# Altium integrated library Lib_MS_V4.0.IntLib: 296 symbols (part 1 of 2) (continued)
## IC_ATMEGA328P-AU (continued)
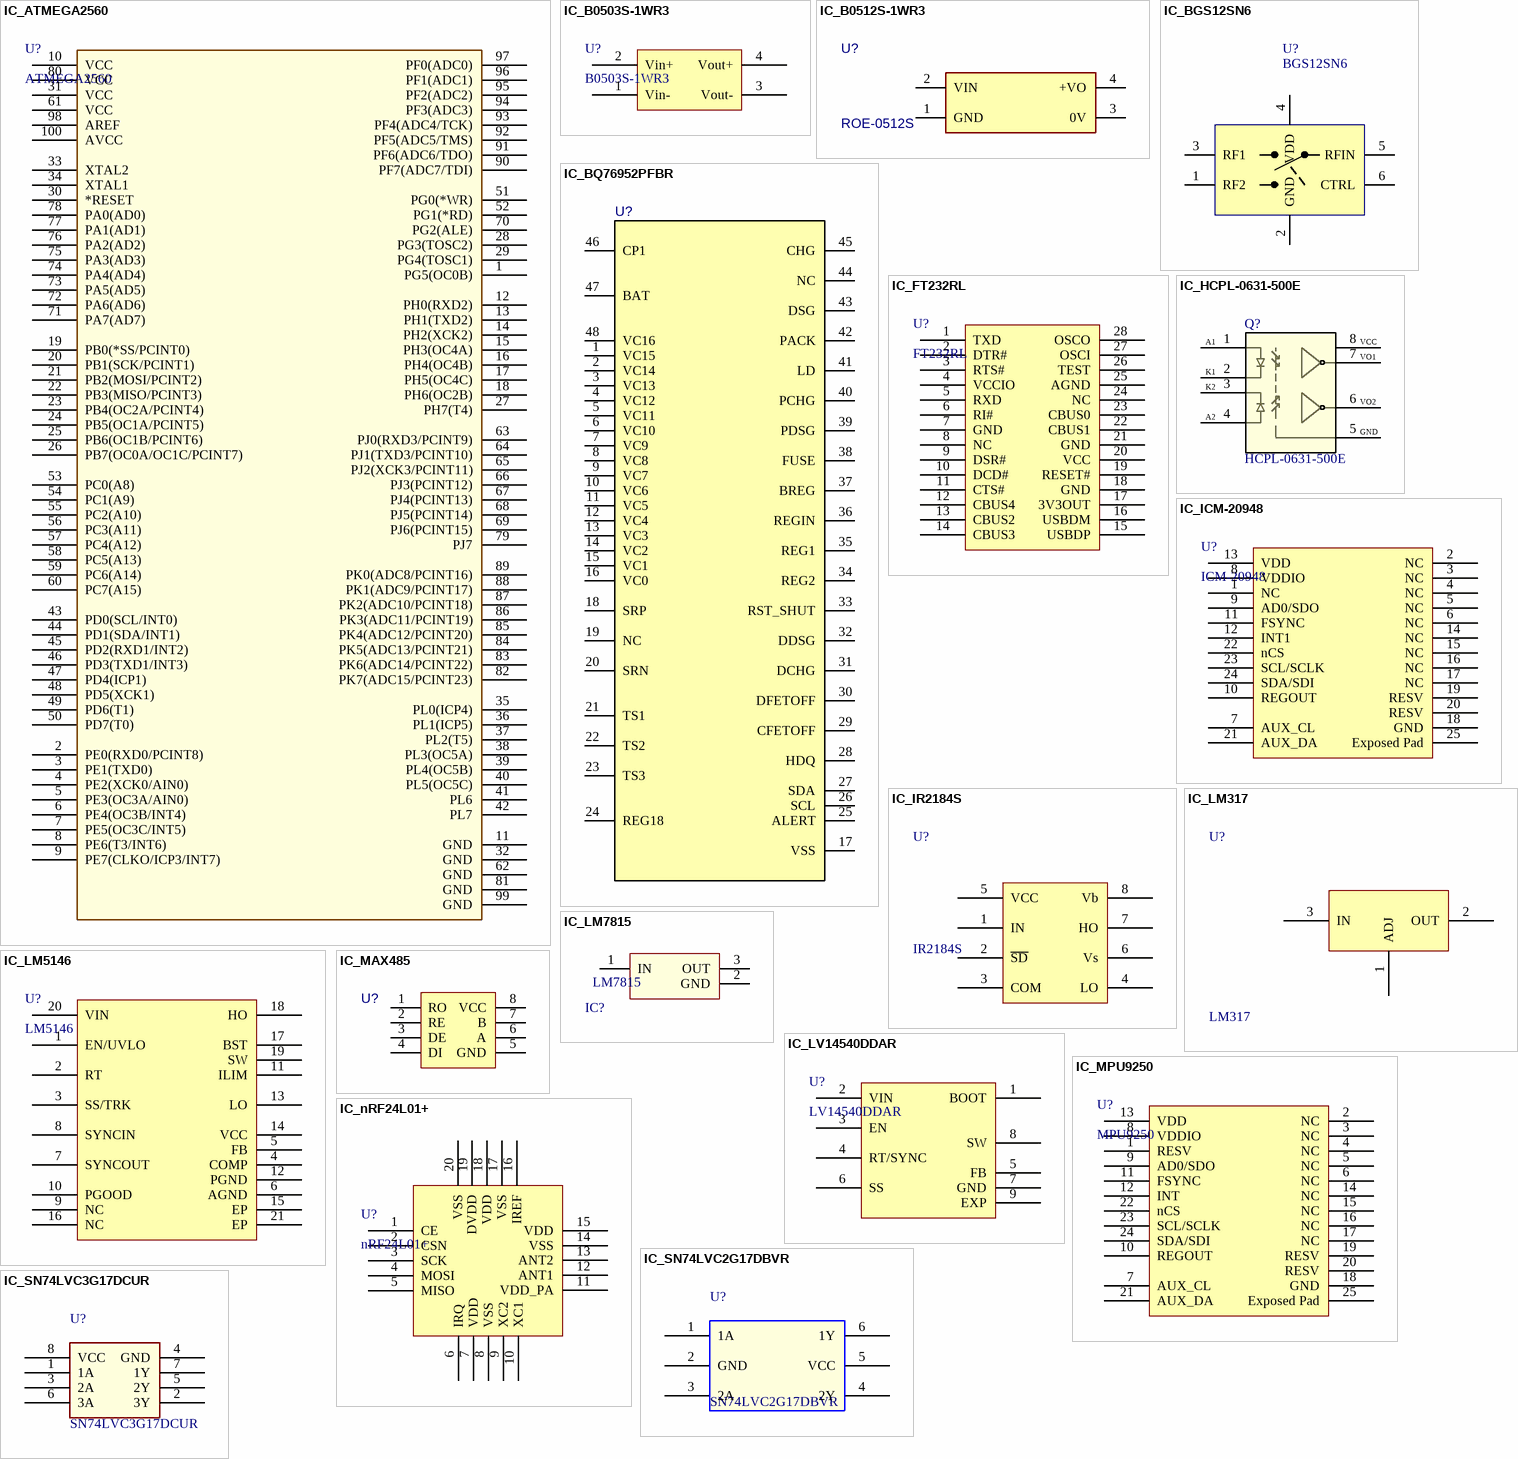
[diagram p3: symbols IC_ATMEGA2560 to IC_SN74LVC3G17DCUR]

## IC_ATMEGA2560
designator U?, comment ATMEGA2560
AVR AVR® ATmega Microcontroller IC 8-Bit 16MHz 256KB (128K x 16) FLASH 100-TQFP (14x14); Sort: MCU; ComponentLink1Description: New link; ComponentLink1URL: https://banlinhkien.com/atmega256016au-tqfp100-p6649411.html; Package: 100-TQFP
footprint IC_ATMEGA2560AU
pins: 1 PG5(OC0B), 2 PE0(RXD0/PCINT8), 3 PE1(TXD0), 4 PE2(XCK0/AIN0), 5 PE3(OC3A/AIN0), 6 PE4(OC3B/INT4), 7 PE5(OC3C/INT5), 8 PE6(T3/INT6), 9 PE7(CLKO/ICP3/INT7), 10 VCC, 11 GND, 12 PH0(RXD2), 13 PH1(TXD2), 14 PH2(XCK2), 15 PH3(OC4A), 16 PH4(OC4B), 17 PH5(OC4C), 18 PH6(OC2B), 19 PB0(*SS/PCINT0), 20 PB1(SCK/PCINT1), 21 PB2(MOSI/PCINT2), 22 PB3(MISO/PCINT3), 23 PB4(OC2A/PCINT4), 24 PB5(OC1A/PCINT5), 25 PB6(OC1B/PCINT6), 26 PB7(OC0A/OC1C/PCINT7), 27 PH7(T4), 28 PG3(TOSC2), 29 PG4(TOSC1), 30 *RESET, 31 VCC, 32 GND, 33 XTAL2, 34 XTAL1, 35 PL0(ICP4), 36 PL1(ICP5), 37 PL2(T5), 38 PL3(OC5A), 39 PL4(OC5B), 40 PL5(OC5C), 41 PL6, 42 PL7, 43 PD0(SCL/INT0), 44 PD1(SDA/INT1), 45 PD2(RXD1/INT2), 46 PD3(TXD1/INT3), 47 PD4(ICP1), 48 PD5(XCK1), 49 PD6(T1), 50 PD7(T0), 51 PG0(*WR), 52 PG1(*RD), 53 PC0(A8), 54 PC1(A9), 55 PC2(A10), 56 PC3(A11), 57 PC4(A12), 58 PC5(A13), 59 PC6(A14), 60 PC7(A15), 61 VCC, 62 GND, 63 PJ0(RXD3/PCINT9), 64 PJ1(TXD3/PCINT10), 65 PJ2(XCK3/PCINT11), 66 PJ3(PCINT12), 67 PJ4(PCINT13), 68 PJ5(PCINT14), 69 PJ6(PCINT15), 70 PG2(ALE), 71 PA7(AD7), 72 PA6(AD6), 73 PA5(AD5), 74 PA4(AD4), 75 PA3(AD3), 76 PA2(AD2), 77 PA1(AD1), 78 PA0(AD0), 79 PJ7, 80 VCC, 81 GND, 82 PK7(ADC15/PCINT23), 83 PK6(ADC14/PCINT22), 84 PK5(ADC13/PCINT21), 85 PK4(ADC12/PCINT20), 86 PK3(ADC11/PCINT19), 87 PK2(ADC10/PCINT18), 88 PK1(ADC9/PCINT17), 89 PK0(ADC8/PCINT16), 90 PF7(ADC7/TDI), 91 PF6(ADC6/TDO), 92 PF5(ADC5/TMS), 93 PF4(ADC4/TCK), 94 PF3(ADC3), 95 PF2(ADC2), 96 PF1(ADC1), 97 PF0(ADC0), 98 AREF, 99 GND, 100 AVCC

## IC_B0503S-1WR3
designator U?, comment B0503S-1WR3
Isolated Module DC DC Converter 1 Output 3.3V 303mA 4.5V - 5.5V Input; Sort: Module Isolated DC-DC; ComponentLink1Description: HS; ComponentLink1URL: https://hshop.vn/nguon-cach-ly-dc-dc-isolated-power-module-hi-link-hlk-b0503s-1wr3-5vdc-to-3-3vdc-1w; ComponentLink2Description: DIGIKEY; ComponentLink2URL: https://www.digikey.bg/en/products/detail/mornsun-america-llc/B0503S-1WR3/13168314?s=N4IgTCBcDaIEIAYCsCDMBlAtARgOoCVUQBdAXyA
footprint IC_B0503S-1WR3
pins: 1 Vin-, 2 Vin+, 3 Vout-, 4 Vout+

## IC_B0512S-1WR3
designator U?, comment ROE-0512S
Isolated Module DC DC Converter 1 Output 12V 84mA 4.5V - 5.5V Input; Power: 1W; Description SEL: DC DC CONVERTER 12V 1W; Part Number: ROE-0512S; Input: 4.5V-5.5V; Output: 12V; Current: 84mA; ComponentLink1Description: DIGIKEY; ComponentLink1URL: https://www.digikey.com/en/products/detail/recom-power/ROE-0512S/5684098
footprint IC_ROE-0512S
pins: 1 GND (power), 2 VIN, 3 0V, 4 +VO

## IC_BGS12SN6
designator U?, comment BGS12SN6
DC switch - Ultra-Low  SPDT analog switch; Manufacturer: INFINEON; Sort: RF Switch; Manufacturer_Part_Number: BGS12SN6; ComponentLink1Description: MOUSER; ComponentLink1URL: https://www.mouser.vn/ProductDetail/Infineon-Technologies/BGS12SN6E6327XTSA1?qs=3%2FhYFTG7CVeGtqdjCCQooA%3D%3D
footprint SON40P70X40-6N (SON, 6-Leads, Body 1.10x0.70mm, Pitch 0.40mm)
pins: 1 RF2, 2 GND, 3 RF1, 4 VDD, 5 RFIN, 6 CTRL

## IC_BQ76952PFBR
designator U?, comment BQ76952PFBR  (value not drawn)
IC BAT LIFEPO4/LI-ION 3-16C TQFP; Manufacturer: Texas Instruments; Point: 48; Part Number: BQ76952PFBR; Description SEL: IC BAT LIFEPO4/LI-ION 3-16C TQFP; ComponentLink1Description: DIGIKEY; ComponentLink1URL: https://www.digikey.com/en/products/detail/texas-instruments/BQ76952PFBR/13427864
footprint IC_BQ76952PFBR
pins: 1 VC15, 2 VC14, 3 VC13, 4 VC12, 5 VC11, 6 VC10, 7 VC9, 8 VC8, 9 VC7, 10 VC6, 11 VC5, 12 VC4, 13 VC3, 14 VC2, 15 VC1, 16 VC0, 17 VSS, 18 SRP, 19 NC, 20 SRN, 21 TS1, 22 TS2, 23 TS3, 24 REG18, 25 ALERT, 26 SCL, 27 SDA, 28 HDQ, 29 CFETOFF, 30 DFETOFF, 31 DCHG, 32 DDSG, 33 RST_SHUT, 34 REG2, 35 REG1, 36 REGIN, 37 BREG, 38 FUSE, 39 PDSG, 40 PCHG, 41 LD, 42 PACK, 43 DSG, 44 NC, 45 CHG, 46 CP1, 47 BAT, 48 VC16

## IC_FT232RL
designator U?, comment FT232RL
USB FULL SPEED TO SERIAL UART IC; Sort: USB FS SERIAL UART; ComponentLink1Description: LKCG; ComponentLink1URL: https://lkcg.vn/linh-kien-ic-ft232rl-chan-dan-ssop28; ComponentLink2Description: DIGIKEY; ComponentLink2URL: https://www.digikey.bg/en/products/detail/ftdi-future-technology-devices-international-ltd/FT232RNL-REEL/16836345
footprint IC_FT232RL
pins: 1 TXD, 2 DTR#, 3 RTS#, 4 VCCIO, 5 RXD, 6 RI#, 7 GND, 8 NC, 9 DSR#, 10 DCD#, 11 CTS#, 12 CBUS4, 13 CBUS2, 14 CBUS3, 15 USBDP, 16 USBDM, 17 3V3OUT, 18 GND, 19 RESET#, 20 VCC, 21 GND, 22 CBUS1, 23 CBUS0, 24 NC, 25 AGND, 26 TEST, 27 OSCI, 28 OSCO

## IC_HCPL-0631-500E
designator Q?, comment HCPL-0631-500E
OPTOISO 3.75KV 2CH OPEN COLL 8SO; Mfr_Name: Broadcom; Type: Optoisolators; ComponentLink1Description: LKD; ComponentLink1URL: https://banlinhkiendientu.vn/hcpl-0631/; ComponentLink2Description: DIGIKEY; ComponentLink2URL: https://www.digikey.com/en/products/detail/broadcom-limited/HCPL-0631-500E/768373; MSL: 1; Temperature: -40°C ~ 85°C
footprint IC_HCPL-0631-500E
pins: 1, 2, 3, 4, 5 GND, 6, 7, 8
text: A1; VCC; VO1; K1; K2; VO2; A2

## IC_ICM-20948
designator U?, comment ICM-20948
Accelerometer, Gyroscope, Magnetometer, 9 Axis Sensor I2C, SPI Output; Sort: IMU; ComponentLink1Description: DIGIKEY; ComponentLink1URL: https://www.digikey.com/en/products/detail/tdk-invensense/ICM-20948/6623535; Package: 24-QFN
footprint IC_MPU9250
pins: 1 NC, 2 NC, 3 NC, 4 NC, 5 NC, 6 NC, 7 AUX_CL, 8 VDDIO, 9 AD0/SDO, 10 REGOUT, 11 FSYNC, 12 INT1, 13 VDD, 14 NC, 15 NC, 16 NC, 17 NC, 18 GND, 19 RESV, 20 RESV, 21 AUX_DA, 22 nCS, 23 SCL/SCLK, 24 SDA/SDI, 25 Exposed Pad

## IC_IR2184S
designator U?, comment IR2184S
Half-Bridge Driver; Manufacture: Infineon Technologies; Mouting Type: SMD; ComponentLink1Description: BLK; ComponentLink1URL: https://banlinhkien.com/ir2184s-sop8-600v-halfbridge-driver-1.4a1.8a-p6653151.html; ComponentLink2Description: Mouser; ComponentLink2URL: https://www.mouser.vn/ProductDetail/Infineon-Technologies/IR2184STRPBF?qs=ellYJlE8XiF5tKx1UCxEUw%3D%3D; Sort: Half-Bridge; Manufacture Part Number: IR2184S; MSL: 1; Temperature: -40°C ~ 150°C
footprint IC_IR2184S
pins: 1 IN, 2 ~{SD}, 3 COM, 4 LO, 5 VCC, 6 Vs, 7 HO, 8 Vb

## IC_LM317
designator U?, comment LM317
Linear Voltage Regulator IC Positive Adjustable 1 Output 1.5A TO-220; Manufacturer: Lumimax Optoelectronic Technology; Vin: 4.2V - 40V; Vout: 1.2V - 37V; Part Number: LM317; Current: 1.5A; Package: TO-220; ComponentLink1Description: BLK; ComponentLink1URL: https://banlinhkien.com/lm317t-to220-reg-ldo-adj-1.5a-p6651263.html; ComponentLink2Description: DIGIKEY; ComponentLink2URL: https://www.digikey.bg/en/products/detail/lumimax-optoelectronic-technology/LM317/24373406
footprint IC_LM7815
pins: 1 ADJ, 2 OUT, 3 IN

## IC_LM5146
designator U?, comment LM5146
Buck Regulator Positive Output Step-Down DC-DC Controller IC 20-VQFN (3.5x4.5); Manufacturer: Texas Instruments; Part Number: LM5146RGYR; Sort: IC REG BUCK; MSL: 2; ComponentLink1Description: DIGIKEY; ComponentLink1URL: https://www.digikey.bg/en/products/detail/texas-instruments/LM5146RGYR/14544372
footprint IC_LM5146
pins: 1 EN/UVLO, 2 RT, 3 SS/TRK, 4 COMP, 5 FB, 6 AGND, 7 SYNCOUT, 8 SYNCIN, 9 NC, 10 PGOOD, 11 ILIM, 12 PGND, 13 LO, 14 VCC, 15 EP, 16 NC, 17 BST, 18 HO, 19 SW, 20 VIN, 21 EP

## IC_LM7815
designator IC?, comment LM7815
Linear Voltage Regulator IC Positive Fixed 1 Output 1A TO-220-3; Manufacturer: Texas Instruments; Part Number: LM7815CT/NOPB; Vin: 35V; Vout: 15V; Current: 1A; Package: TO-220-3
footprint IC_LM7815
pins: 1 IN, 2 GND, 3 OUT

## IC_LV14540DDAR
designator U?, comment LV14540DDAR
Buck Switching Regulator IC Positive Adjustable 0.8V 1 Output 5A 8-PowerSOIC (0.154", 3.90mm Width); Sort: IC Reg Buck; ComponentLink1Description: Aliexpress; ComponentLink1URL: https://vi.aliexpress.com/item/1005008065358411.html?spm=a2g0o.productlist.main.1.7e89Dx16Dx16m5&algo_pvid=ad094eb1-607a-4bec-86f1-b8c480b560e9&algo_exp_id=ad094eb1-607a-4bec-86f1-b8c480b560e9-0&pdp_ext_f=%7B%22order%22%3A%22-1%22%2C%22eval%22%3A%221%22%7D&pdp_npi=4%40dis%21VND%2162327%2162327%21%21%2117.30%2117.30%21%402140f53817468421014663818eb33d%2112000043513459686%21sea%21VN%214100105060%21X&curPageLogUid=bj85XK5ikHDZ&utparam-url=scene%3Asearch%7Cquery_from%3A; ComponentLink2Description: MOUSER; ComponentLink2URL: https://www.mouser.vn/ProductDetail/Texas-Instruments/LV14540DDAR?qs=GBLSl2Akiru4zvJrnTzNww%3D%3D; Package: 8-PowerSOIC
footprint IC_LV14540DDAR_SOIC
pins: 1 BOOT, 2 VIN, 3 EN, 4 RT/SYNC, 5 FB, 6 SS, 7 GND, 8 SW, 9 EXP

## IC_MAX485
designator U?, comment MAX485  (value not drawn)
Part Number: MAX485ESA+T; Description SEL: IC TRANSCEIVER HALF 1/1 8SOIC; Sort: TRANSCEIVER; ComponentLink1Description: LKD; ComponentLink1URL: https://banlinhkiendientu.vn/max485-max485csa/; Package: 8-SOIC
footprint SOIC8_NOTHERMAL
pins: 1 RO, 2 RE, 3 DE, 4 DI, 5 GND, 6 A, 7 B, 8 VCC

## IC_MPU9250
designator U?, comment MPU9250
Accelerometer, Gyroscope, Magnetometer, 9 Axis Sensor I2C, SPI Output; Sort: IMU; ComponentLink1Description: CXT; ComponentLink1URL: https://linhkien.cxtvn.com/6790-mpu-9250-imu-accelgyromag-i2cspi-24qfn.html; Package: 24-QFN
footprint IC_MPU9250
pins: 1 RESV, 2 NC, 3 NC, 4 NC, 5 NC, 6 NC, 7 AUX_CL, 8 VDDIO, 9 AD0/SDO, 10 REGOUT, 11 FSYNC, 12 INT, 13 VDD, 14 NC, 15 NC, 16 NC, 17 NC, 18 GND, 19 RESV, 20 RESV, 21 AUX_DA, 22 nCS, 23 SCL/SCLK, 24 SDA/SDI, 25 Exposed Pad

## IC_nRF24L01+
designator U?, comment nRF24L01+
Single Chip 2.4GHz Transceiver; Sort: RF; Package: QFN20 4X4
footprint IC_ nRF24L01+
pins: 1 CE, 2 CSN, 3 SCK, 4 MOSI, 5 MISO, 6 IRQ, 7 VDD, 8 VSS, 9 XC2, 10 XC1, 11 VDD_PA, 12 ANT1, 13 ANT2, 14 VSS, 15 VDD, 16 IREF, 17 VSS, 18 VDD, 19 DVDD, 20 VSS

## IC_SN74LVC2G17DBVR
designator U?, comment SN74LVC2G17DBVR
IC BUF NON-INVERT 5.5V SC70-6; Mfr_Name: Texas Instruments; Mouting type: SMD; Sort: BUFF NON-INVERT; Manufacturer_Part_Number: SN74LVC2G17DBVR; MSL: 1; ComponentLink1Description: DIGIKEY; ComponentLink1URL: https://www.digikey.bg/en/products/detail/texas-instruments/SN74LVC2G17DBVR/479735; Package: SOT-23-6
footprint IC_SN74LVC2G17DBVR
pins: 1 1A, 2 GND, 3 2A, 4 2Y, 5 VCC, 6 1Y

## IC_SN74LVC3G17DCUR
designator U?, comment SN74LVC3G17DCUR
Buffer, Non-Inverting 3 Element 1 Bit per Element Push-Pull Output 8-VSSOP; Mfr_Name: Texas Instruments; Mouting type: SMD; Sort: BUFF NON-INVERT; Manufacturer_Part_Number: SN74LVC3G17DCUR; MSL: 1; ComponentLink1Description: CXT; ComponentLink1URL: https://linhkien.cxtvn.com/10332-sn74lvc3g17dcur-ic-buffer-non-invert-55v-8vssop.html; ComponentLink2Description: DIGIKEY; ComponentLink2URL: https://www.digikey.com/en/products/detail/texas-instruments/SN74LVC3G17DCUR/863652; Package: 8-VSSOP
footprint IC_SN74LVC3G17DCUR
pins: 1 1A, 2 3Y, 3 2A, 4 GND, 5 2Y, 6 3A, 7 1Y, 8 VCC

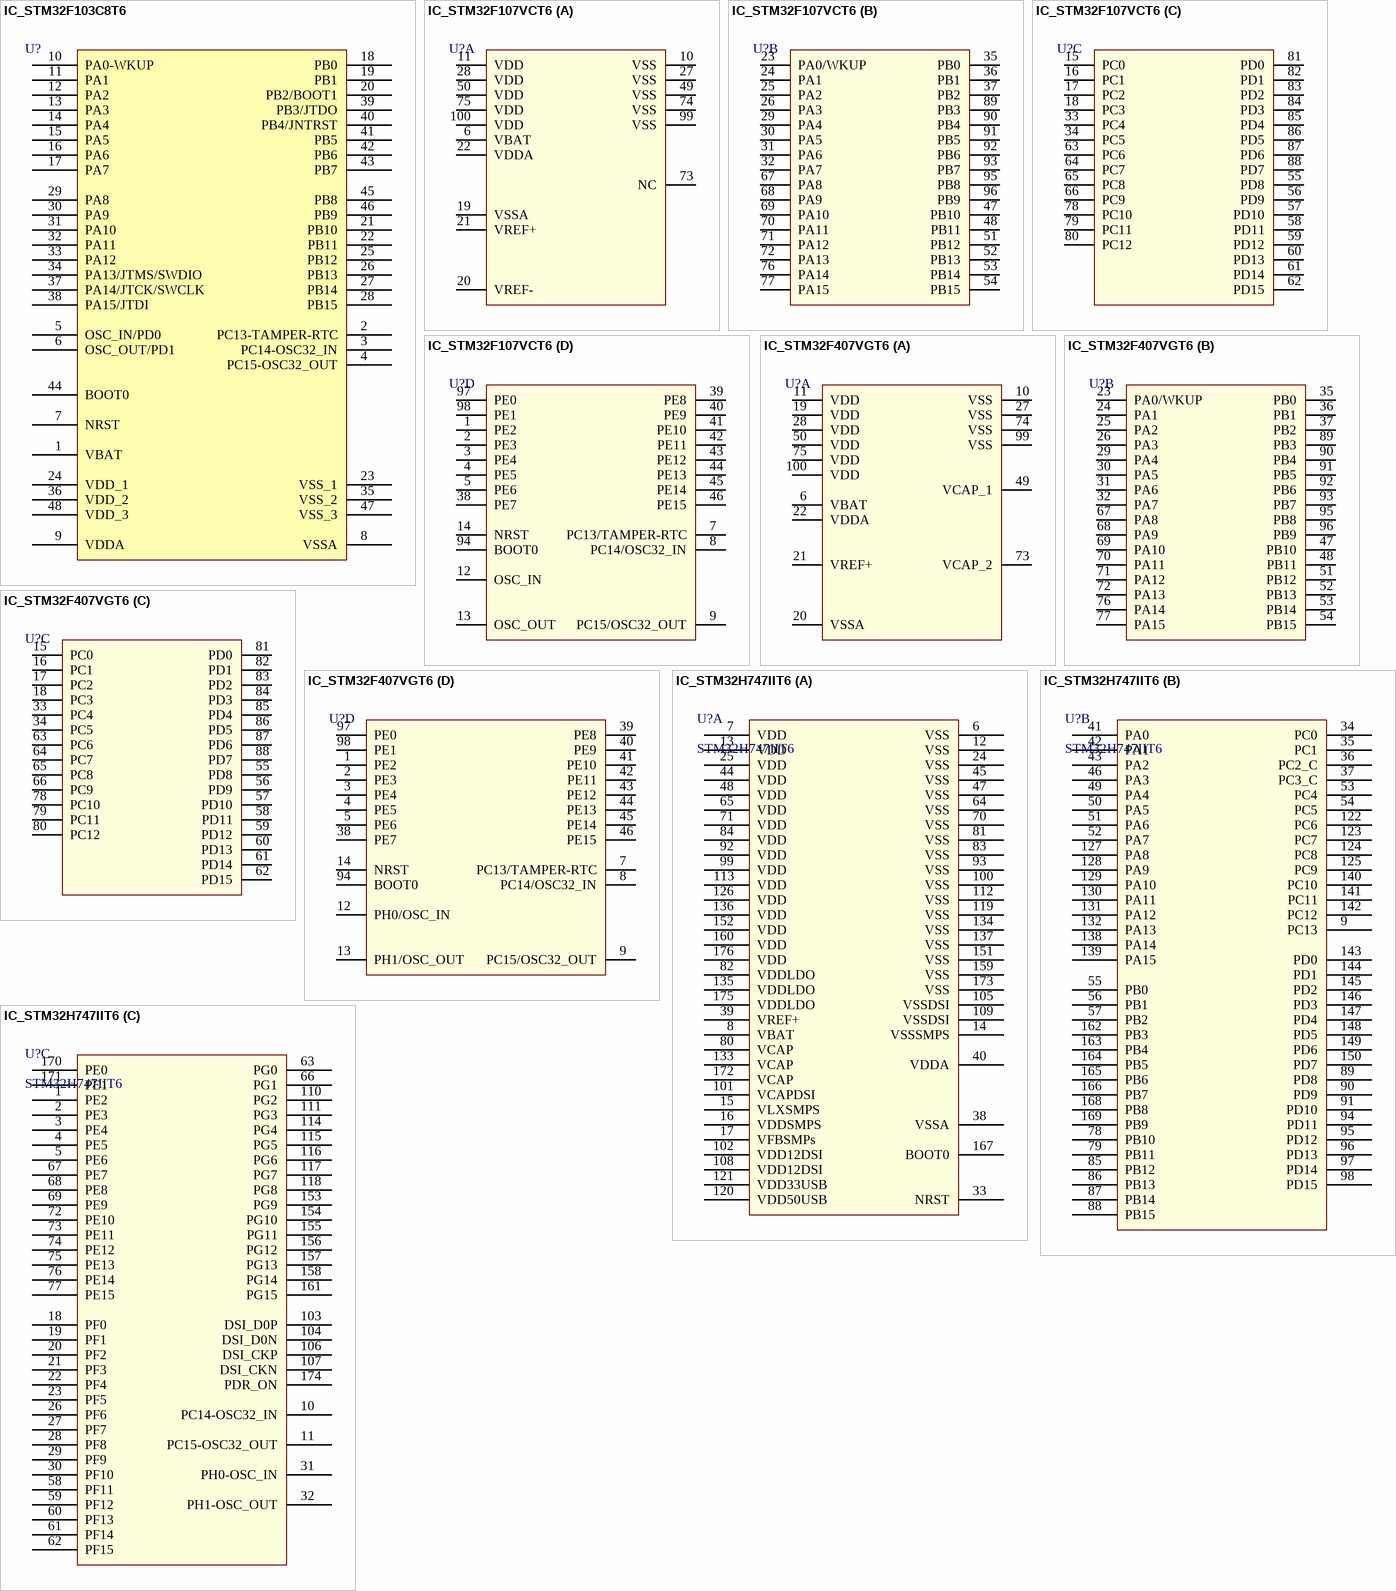
[diagram p4: symbols IC_STM32F103C8T6 to IC_STM32H747IIT6]

## IC_STM32F103C8T6
designator U?, comment STM32F103C8T6  (value not drawn)
STM32 ARM-based 32-bit MCU with 64 Kbytes Flash, 48-pin LQFP, Industrial Temperature; PackageReference: LQFP48; ComponentLink3Description: CXT; ComponentLink3URL: https://linhkien.cxtvn.com/1130-stm32f103c8t6-ic-mcu-32-bit-64kb-flash-48lqfp.html; Sort: MCU
footprint IC_STM32F103C8T6
pins: 1 VBAT, 2 PC13-TAMPER-RTC, 3 PC14-OSC32_IN, 4 PC15-OSC32_OUT, 5 OSC_IN/PD0, 6 OSC_OUT/PD1, 7 NRST, 8 VSSA, 9 VDDA, 10 PA0-WKUP, 11 PA1, 12 PA2, 13 PA3, 14 PA4, 15 PA5, 16 PA6, 17 PA7, 18 PB0, 19 PB1, 20 PB2/BOOT1, 21 PB10, 22 PB11, 23 VSS_1, 24 VDD_1, 25 PB12, 26 PB13, 27 PB14, 28 PB15, 29 PA8, 30 PA9, 31 PA10, 32 PA11, 33 PA12, 34 PA13/JTMS/SWDIO, 35 VSS_2, 36 VDD_2, 37 PA14/JTCK/SWCLK, 38 PA15/JTDI, 39 PB3/JTDO, 40 PB4/JNTRST, 41 PB5, 42 PB6, 43 PB7, 44 BOOT0, 45 PB8, 46 PB9, 47 VSS_3, 48 VDD_3

## IC_STM32F107VCT6
designator U?, comment STM32F107VCT6  (value not drawn)
Sort: MCU; ComponentLink1Description: CXT; ComponentLink1URL: https://linhkien.cxtvn.com/1565-stm32f107vct6-ic-mcu-32-bit-256kb-flash-lqfp100.html; ComponentLink2Description: MOUSER; ComponentLink2URL: https://www.mouser.vn/ProductDetail/STMicroelectronics/STM32F107VCT6?qs=1XJIe8X6XT1KmS9%252Be0Uqlg%3D%3D&srsltid=AfmBOook5THpVA88VouslcCXgHKMMoEBzzSPGBngcTiByRy0ecgl8l23; Package: 100LQFP
footprint IC_STM32F107VCT6
part A pins: 6 VBAT, 10 VSS, 11 VDD, 19 VSSA, 20 VREF-, 21 VREF+, 22 VDDA, 27 VSS, 28 VDD, 49 VSS, 50 VDD, 73 NC, 74 VSS, 75 VDD, 99 VSS, 100 VDD
part B pins: 23 PA0/WKUP, 24 PA1, 25 PA2, 26 PA3, 29 PA4, 30 PA5, 31 PA6, 32 PA7, 35 PB0, 36 PB1, 37 PB2, 47 PB10, 48 PB11, 51 PB12, 52 PB13, 53 PB14, 54 PB15, 67 PA8, 68 PA9, 69 PA10, 70 PA11, 71 PA12, 72 PA13, 76 PA14, 77 PA15, 89 PB3, 90 PB4, 91 PB5, 92 PB6, 93 PB7, 95 PB8, 96 PB9
part C pins: 15 PC0, 16 PC1, 17 PC2, 18 PC3, 33 PC4, 34 PC5, 55 PD8, 56 PD9, 57 PD10, 58 PD11, 59 PD12, 60 PD13, 61 PD14, 62 PD15, 63 PC6, 64 PC7, 65 PC8, 66 PC9, 78 PC10, 79 PC11, 80 PC12, 81 PD0, 82 PD1, 83 PD2, 84 PD3, 85 PD4, 86 PD5, 87 PD6, 88 PD7
part D pins: 1 PE2, 2 PE3, 3 PE4, 4 PE5, 5 PE6, 7 PC13/TAMPER-RTC, 8 PC14/OSC32_IN, 9 PC15/OSC32_OUT, 12 OSC_IN, 13 OSC_OUT, 14 NRST, 38 PE7, 39 PE8, 40 PE9, 41 PE10, 42 PE11, 43 PE12, 44 PE13, 45 PE14, 46 PE15, 94 BOOT0, 97 PE0, 98 PE1

## IC_STM32F407VGT6
designator U?, comment STM32F407VGT6  (value not drawn)
Sort: MCU; ComponentLink1Description: CXT; ComponentLink1URL: https://linhkien.cxtvn.com/1555-stm32f407vgt6ic-mcu-32bit-1mb-flash-100lqfp.html; Package: 100LQFP
footprint IC_STM32F107VCT6
part A pins: 6 VBAT, 10 VSS, 11 VDD, 19 VDD, 20 VSSA, 21 VREF+, 22 VDDA, 27 VSS, 28 VDD, 49 VCAP_1, 50 VDD, 73 VCAP_2, 74 VSS, 75 VDD, 99 VSS, 100 VDD
part B pins: 23 PA0/WKUP, 24 PA1, 25 PA2, 26 PA3, 29 PA4, 30 PA5, 31 PA6, 32 PA7, 35 PB0, 36 PB1, 37 PB2, 47 PB10, 48 PB11, 51 PB12, 52 PB13, 53 PB14, 54 PB15, 67 PA8, 68 PA9, 69 PA10, 70 PA11, 71 PA12, 72 PA13, 76 PA14, 77 PA15, 89 PB3, 90 PB4, 91 PB5, 92 PB6, 93 PB7, 95 PB8, 96 PB9
part C pins: 15 PC0, 16 PC1, 17 PC2, 18 PC3, 33 PC4, 34 PC5, 55 PD8, 56 PD9, 57 PD10, 58 PD11, 59 PD12, 60 PD13, 61 PD14, 62 PD15, 63 PC6, 64 PC7, 65 PC8, 66 PC9, 78 PC10, 79 PC11, 80 PC12, 81 PD0, 82 PD1, 83 PD2, 84 PD3, 85 PD4, 86 PD5, 87 PD6, 88 PD7
part D pins: 1 PE2, 2 PE3, 3 PE4, 4 PE5, 5 PE6, 7 PC13/TAMPER-RTC, 8 PC14/OSC32_IN, 9 PC15/OSC32_OUT, 12 PH0/OSC_IN, 13 PH1/OSC_OUT, 14 NRST, 38 PE7, 39 PE8, 40 PE9, 41 PE10, 42 PE11, 43 PE12, 44 PE13, 45 PE14, 46 PE15, 94 BOOT0, 97 PE0, 98 PE1

## IC_STM32H747IIT6
designator U?, comment STM32H747IIT6
IC MCU 32BIT 2MB FLASH 176LQFP; ComponentLink1Description: DIGIKEY; ComponentLink1URL: https://www.digikey.com/en/products/detail/stmicroelectronics/STM32H747IIT6/10326796?s=N4IgTCBcDaIMoBUCyBmMAJA7AFkwSTwQDYQBdAXyA; Package: 176-LQFP; Sort: MCU; Temperature: -40°C ~ 85°C; MSL: 3
footprint IC_STM32H747IIT6
part A pins: 6 VSS, 7 VDD, 8 VBAT, 12 VSS, 13 VDD, 14 VSSSMPS, 15 VLXSMPS, 16 VDDSMPS, 17 VFBSMPs, 24 VSS, 25 VDD, 33 NRST, 38 VSSA, 39 VREF+, 40 VDDA, 44 VDD, 45 VSS, 47 VSS, 48 VDD, 64 VSS, 65 VDD, 70 VSS, 71 VDD, 80 VCAP, 81 VSS, 82 VDDLDO, 83 VSS, 84 VDD, 92 VDD, 93 VSS, 99 VDD, 100 VSS, 101 VCAPDSI, 102 VDD12DSI, 105 VSSDSI, 108 VDD12DSI, 109 VSSDSI, 112 VSS, 113 VDD, 119 VSS, 120 VDD50USB, 121 VDD33USB, 126 VDD, 133 VCAP, 134 VSS, 135 VDDLDO, 136 VDD, 137 VSS, 151 VSS, 152 VDD, 159 VSS, 160 VDD, 167 BOOT0, 172 VCAP, 173 VSS, 175 VDDLDO, 176 VDD
part B pins: 9 PC13, 34 PC0, 35 PC1, 36 PC2_C, 37 PC3_C, 41 PA0, 42 PA1, 43 PA2, 46 PA3, 49 PA4, 50 PA5, 51 PA6, 52 PA7, 53 PC4, 54 PC5, 55 PB0, 56 PB1, 57 PB2, 78 PB10, 79 PB11, 85 PB12, 86 PB13, 87 PB14, 88 PB15, 89 PD8, 90 PD9, 91 PD10, 94 PD11, 95 PD12, 96 PD13, 97 PD14, 98 PD15, 122 PC6, 123 PC7, 124 PC8, 125 PC9, 127 PA8, 128 PA9, 129 PA10, 130 PA11, 131 PA12, 132 PA13, 138 PA14, 139 PA15, 140 PC10, 141 PC11, 142 PC12, 143 PD0, 144 PD1, 145 PD2, 146 PD3, 147 PD4, 148 PD5, 149 PD6, 150 PD7, 162 PB3, 163 PB4, 164 PB5, 165 PB6, 166 PB7, 168 PB8, 169 PB9
part C pins: 1 PE2, 2 PE3, 3 PE4, 4 PE5, 5 PE6, 10 PC14-OSC32_IN, 11 PC15-OSC32_OUT, 18 PF0, 19 PF1, 20 PF2, 21 PF3, 22 PF4, 23 PF5, 26 PF6, 27 PF7, 28 PF8, 29 PF9, 30 PF10, 31 PH0-OSC_IN, 32 PH1-OSC_OUT, 58 PF11, 59 PF12, 60 PF13, 61 PF14, 62 PF15, 63 PG0, 66 PG1, 67 PE7, 68 PE8, 69 PE9, 72 PE10, 73 PE11, 74 PE12, 75 PE13, 76 PE14, 77 PE15, 103 DSI_D0P, 104 DSI_D0N, 106 DSI_CKP, 107 DSI_CKN, 110 PG2, 111 PG3, 114 PG4, 115 PG5, 116 PG6, 117 PG7, 118 PG8, 153 PG9, 154 PG10, 155 PG11, 156 PG12, 157 PG13, 158 PG14, 161 PG15, 170 PE0, 171 PE1, 174 PDR_ON
